# Altium integrated library main-board.IntLib: 26 symbols
Pins are listed as number, name and electrical type; pins without a type are passive.

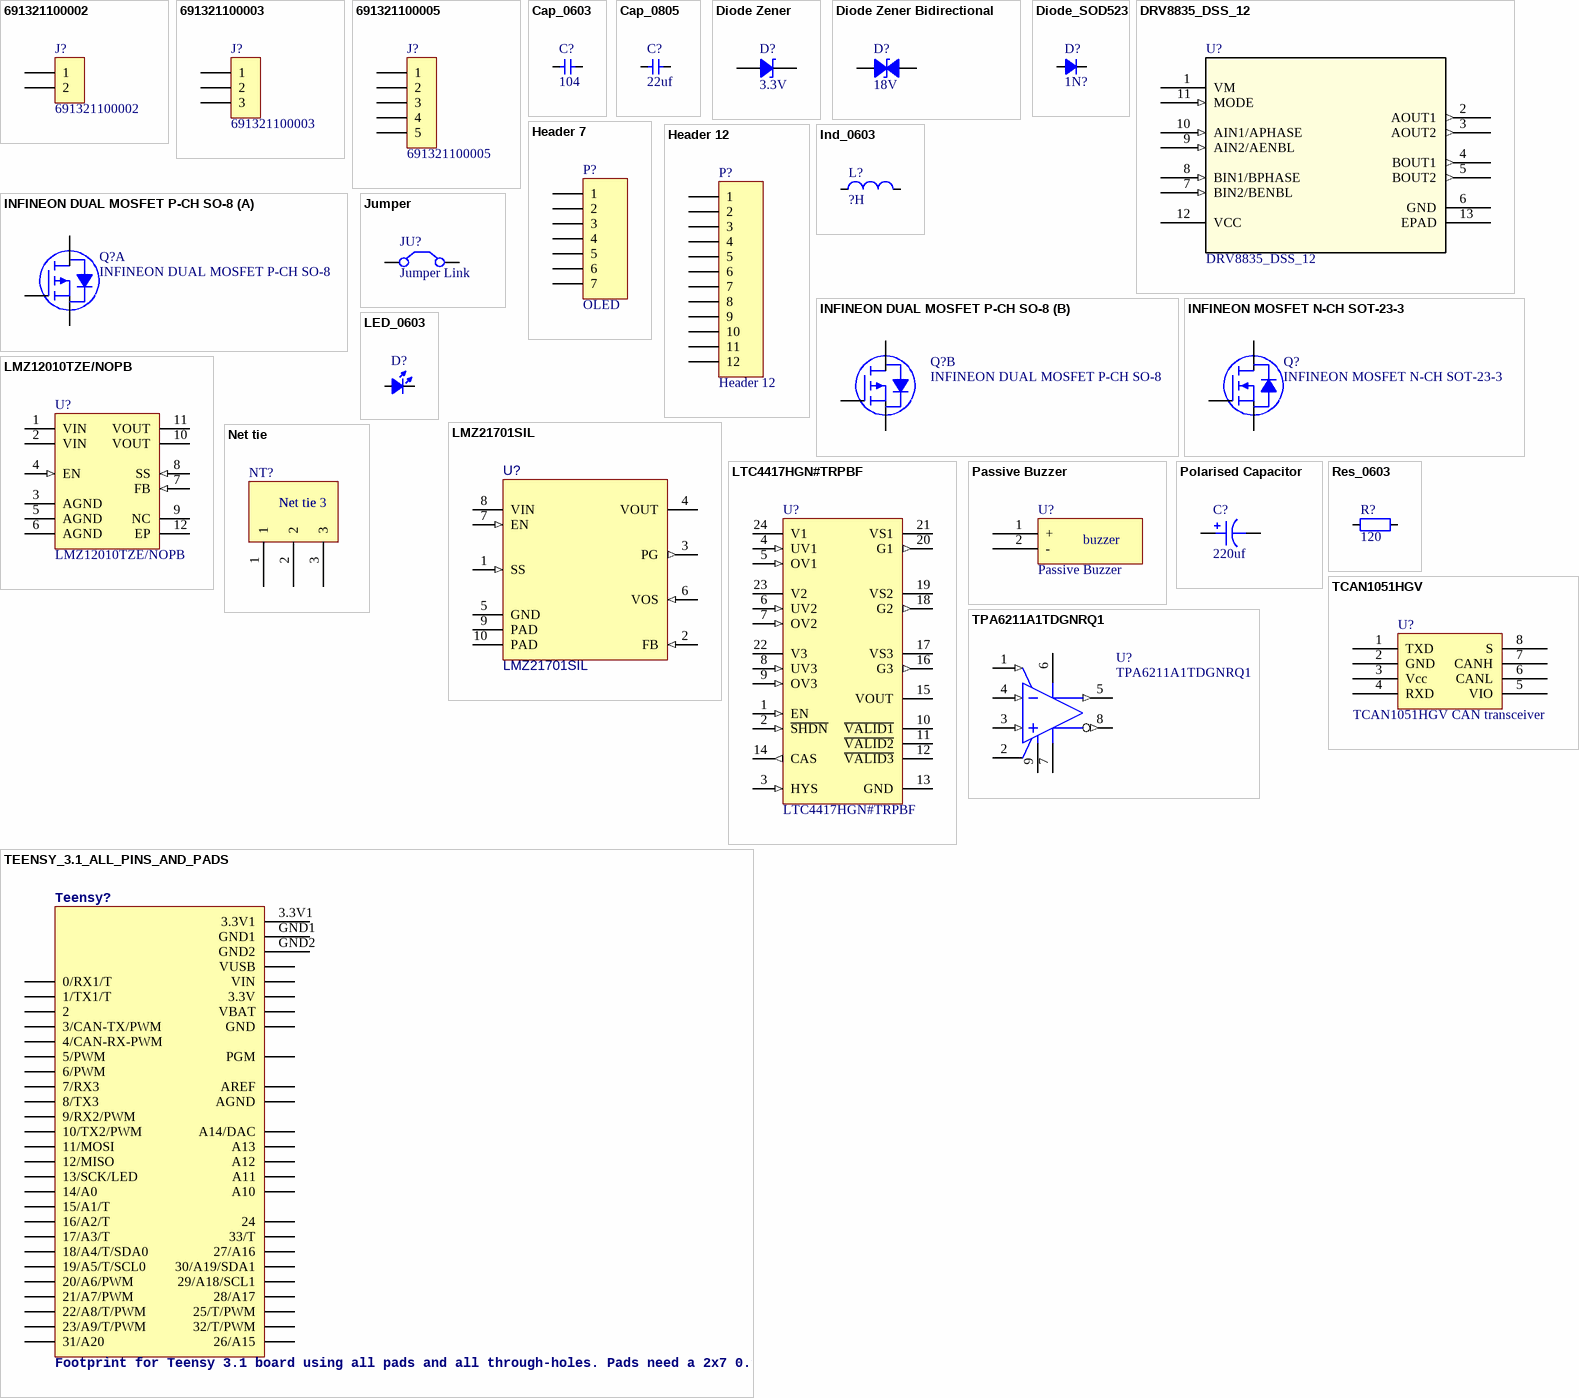
[diagram p0: symbols 691321100002 to TPA6211A1TDGNRQ1]

## 691321100002
designator J?
WR-TBL Terminal block - serie 3211 - 3.50 mm; Manufacturer: Würth Elektronik eiSos GmbH; ComponentLink1 Description: Manufacturer; ComponentLink2 Description: Datasheet; NoPins: 2; Created Date: 9 December 2013; partNo: 691321100002; ComponentLink1URL: http://www.we-online.com; ComponentLink2URL: http://katalog.we-online.de/em/datasheet/6913211000xx.pdf; Created by: Karrer Zheng
footprint 691321100002 (3,50mm - PCB Vertical - 02p)
footprint 691322110002 (3,50mm - PCB Horizontal - 02p)
pins: 1, 2

## 691321100003
designator J?
WR-TBL Terminal block - serie 3211 - 3.50 mm; Manufacturer: Würth Elektronik eiSos GmbH; ComponentLink1 Description: Manufacturer; ComponentLink2 Description: Datasheet; NoPins: 3; Created Date: 9 December 2013; partNo: 691321100003; ComponentLink1URL: http://www.we-online.com; ComponentLink2URL: http://katalog.we-online.de/em/datasheet/6913211000xx.pdf; Created by: Karrer Zheng
footprint 691321100003 (3,50mm - PCB Vertical - 03p)
footprint 691322110003 (3,50mm - PCB Horizontal - 03p)
pins: 1, 2, 3

## 691321100005
designator J?
WR-TBL Terminal block - serie 3211 - 3.50 mm; Manufacturer: Würth Elektronik eiSos GmbH; ComponentLink1 Description: Manufacturer; ComponentLink2 Description: Datasheet; NoPins: 5; Created Date: 9 December 2013; partNo: 691321100005; ComponentLink1URL: http://www.we-online.com; ComponentLink2URL: http://katalog.we-online.de/em/datasheet/6913211000xx.pdf; Created by: Karrer Zheng
footprint 691321100005 (3,50mm - PCB Vertical - 05p)
footprint 691322110005 (3,50mm - PCB Horizontal - 05p)
pins: 1, 2, 3, 4, 5

## Cap_0603
designator C?  value 104  (hidden comment: Cap_0603)
Capacitor
footprint CAP_0603
pins: 1, 2

## Cap_0805
designator C?  value 22uf  (hidden comment: Cap_0805)
Capacitor
footprint CAP_0805
pins: 1, 2

## Diode Zener
designator D?, comment 3.3V
Zener Diode
footprint SOD123F (SODFL, 2-Leads, Body 1.60x3.50mm, IPC Medium Density)
pins: 1, 2

## Diode Zener Bidirectional
designator D?, comment 18V
Bidirectional Zener Diode
footprint SOD123F (SODFL, 2-Leads, Body 1.60x3.50mm, IPC Medium Density)
pins: 1, 2

## Diode_SOD523
designator D?  value 1N?  (hidden comment: Diode_SOD523)
Diode
footprint SOD123F (SODFL, 2-Leads, Body 1.60x3.50mm, IPC Medium Density)
pins: 1 A, 2 K

## DRV8835_DSS_12
designator U?
Imported; Vendor: Texas Instruments; Manufacturer_Part_Number: drv8835_dss_12; Value: Value; Type: Type; RefDes: RefDes
footprint DSS12_P9X2
pins: 1 VM (power), 2 AOUT1 (out), 3 AOUT2 (out), 4 BOUT1 (out), 5 BOUT2 (out), 6 GND (power), 7 BIN2/BENBL (in), 8 BIN1/BPHASE (in), 9 AIN2/AENBL (in), 10 AIN1/APHASE (in), 11 MODE (in), 12 VCC (power), 13 EPAD

## Header 7
designator P?, comment OLED
Header, 7-Pin; LatestRevisionDate: 17-Jul-2002; LatestRevisionNote: Re-released for DXP Platform.; Publisher: Altium Limited
footprint HDR1X7 (Connector; Header; 7 Position)
signal-integrity model Connector
pins: 1, 2, 3, 4, 5, 6, 7

## Header 12
designator P?
Header, 12-Pin; LatestRevisionDate: 17-Jul-2002; LatestRevisionNote: Re-released for DXP Platform.; Publisher: Altium Limited
footprint HDR1X12 (Connector; Header; 12 Position)
signal-integrity model Connector
pins: 1, 2, 3, 4, 5, 6, 7, 8, 9, 10, 11, 12

## Ind_0603
designator L?  value ?H  (hidden comment: Ind_0603)
Inductor
footprint IND_0603
pins: 1, 2

## INFINEON DUAL MOSFET P-CH SO-8
designator Q?
footprint INFINEON SO-8 (SOIC, 8-Leads, Body 4.90x3.90mm, Pitch 1.27mm, IPC Medium Density)
part A pins: 1 S1, 2 G1, 7 D1, 8 D1
part B pins: 3 S2, 4 G2, 5 D2, 6 D2

## INFINEON MOSFET N-CH SOT-23-3
designator Q?
footprint INFINEON SOT-23-3 (SOT23, 3-Leads, Body 2.90x2.40mm, Pitch 0.95mm, IPC Medium Density)
pins: 1 G, 2 D, 3 S

## Jumper
designator JU?, comment Jumper Link
Jumper Wire; Published: 24-Mar-1999; LatestRevisionDate: 17-Jul-2002; LatestRevisionNote: Re-released for DXP Platform.; PackageReference: RAD-0.2; Publisher: Altium Limited; PackageDescription: Radial Cap, Thru-Hole; 2 Leads; 0.2 in Pin Spacing; ClassName: no-clearance-check
footprint jumper_56.5
pins: 1 C1, 2 C2

## LED_0603
designator D?  (value not drawn)
LED
footprint LED_0603_GREEN
footprint LED_0603_BLUE
footprint LED_0603_RED
footprint LED_0603_ORANGE
footprint LED_0603_YELLOW
pins: 1 A, 2 K

## LMZ12010TZE/NOPB
designator U?
10A, SIMPLE SWITCHER® Power Module with 20V Maximum Input, 11 pin TO-PMOD, 250 Reel; Manufacturer: National Semiconductor; PackageTopMarking: NSUZXYTTE#*LMZ12010; PowerWise: N; High-Reliability: Y; DatasheetVersion: Apr-2011; PackageVersion: revE, Apr-2011; PackageReference: TZA11A; PackageDescription: TO-PMOD, 15 x 15 x 5.9 mm Body, 11 Lead, 1.27 mm Pitch, Surface Mount; PartNumber: LMZ12010TZE/NOPB; RoHS: Y; PinCount: 11; CompType: Switcher; ComponentLink1Description: Manufacturer URL; ComponentLink1URL: http://www.national.com/; ComponentLink2Description: LMZ12010 Datasheet; ComponentLink2URL: http://www.national.com/ds/LM/LMZ12010.pdf; ComponentLink3Description: LMZ12010 Web Page; ComponentLink3URL: http://www.national.com/pf/LM/LMZ12010.html; ComponentLink4Description: TZA11A Package Page; ComponentLink4URL: http://www.national.com/packaging/folders/tza11a.html
footprint TZA11A_V (TO, 12-Leads, Body 15x15mm, Pitch 1.27mm, Lead Span 17.8mm, NSC Recommended)
pins: 1 VIN (power), 2 VIN (power), 3 AGND (power), 4 EN (in), 5 AGND (power), 6 AGND (power), 7 FB (in), 8 SS (in), 9 NC, 10 VOUT (power), 11 VOUT (power), 12 EP (power)

## LMZ21701SIL
designator U?
1A SIMPLE SWITCHER Nano Module with 17V Maximum Input Voltage, SIL0008E; Alternate Manufacturer: None; Manufacturer: Texas Instruments; SymbolCreator: a0411947; CompType: IC; U/M: EA; SymbolVersion: 2013-08-23; PartNumber: LMZ21701SIL; PackageReference: SIL0008E; MountType: SMT; ComponentLink1Description: Datasheet Link; ComponentLink1URL: https://sps06.itg.ti.com/sites/KMS/crossdivteams/altium/docs/ComponentDatasheets/LMZ21701_DS_2013_07_10.pdf; RoHS: Y; Publisher: Texas Instruments; LatestRevisionDate: 2014-08-23
footprint LMZ21701SIL
pins: 1 SS (in), 2 FB (in), 3 PG (out), 4 VOUT (power), 5 GND (power), 6 VOS (in), 7 EN (in), 8 VIN (power), 9 PAD (power), 10 PAD (power)
1 alternate drawing of the same symbol

## LTC4417HGN#TRPBF
designator U?
Prioritized PowerPath Controller, 2.5 to 36 V Vin, 24-pin SOP (GN-24), -40 to 125 degC, Pb-Free, Tape and Reel; Manufacturer: Linear Technology; Ideal Diode: Triple, External, P-Channel; PackageVersion: Rev. B, 03/2012; PackageReference: GN24; PackageDescription: 24-Pin Plastic SSOP , Body 8.5 x 3.9 mm, Pitch 0.635 mm; Supplier 1: Digi-Key; Supplier Part Number 1: LTC4417HGN#TRPBF-ND; Supplier 2: Newark; Supplier Part Number 2: 53W0557; Packing: Tape and Reel; RoHS: TRUE; Mounting Technology: Surface Mount; PartNumber: LTC4417HGN#TRPBF; ComponentLink1Description: Manufacturer URL; ComponentLink1URL: http://www.linear.com/; ComponentLink2Description: Datasheet; ComponentLink2URL: http://cds.linear.com/docs/en/datasheet/4417f.pdf; ComponentLink3Description: Package Specification; ComponentLink3URL: http://cds.linear.com/docs/en/packaging/05081641_B_GN24.pdf
footprint LT-GN-24_N (SOP, 24-Leads, Body 8.7x4mm, Pitch 0.635mm, IPC Medium Density)
footprint LT-GN-24_L (SOP, 24-Leads, Body 8.7x4mm, Pitch 0.635mm, IPC High Density)
footprint LT-GN-24_M (SOP, 24-Leads, Body 8.7x4mm, Pitch 0.635mm, IPC Low Density)
pins: 1 EN (in) "Channel Enable Input. EN is a high voltage input that allows the user to quickly connect and disconnect channels without resetting the OV/UV timers. When below 1V, all external back-to-back P-channel MOSFETs are driven off (See Datasheet)", 2 ~{SHDN} (in) "Shutdown Input. Driving S\H\D\N\ below 0.8V turns off all external back-to-back P-channel MOSFET devices, forces the LTC4417 into a low current state, and resets the 256ms timers used to validate V1, V2 and V3. Driving (See Datasheet)", 3 HYS (in) "OV/UV Comparator Hysteresis Input. Connecting HYS to ground sets a fixed 30mV hysteresis for the OV and UV comparators. Connecting a resistor, RHYS, between HYS and ground disables the internal 30mV hysteresis and sets a (See Datasheet)", 4 UV1 (in) "Undervoltage Comparator Inputs. Falling voltages below 1V signal an undervoltage event, invalidating the respective input supply channel. Connect UV1, UV2 and UV3 through a resistive divider between the respective V1, V2 and (See Datasheet)", 5 OV1 (in) "Overvoltage Comparator Inputs. Rising voltages above 1V signal an over voltage event, invalidating the respective input supply channel. Connect OV1, OV2 and OV3 to an external resistive divider from its respective V1, V2 and (See Datasheet)", 6 UV2 (in) "Undervoltage Comparator Inputs. Falling voltages below 1V signal an undervoltage event, invalidating the respective input supply channel. Connect UV1, UV2 and UV3 through a resistive divider between the respective V1, V2 and (See Datasheet)", 7 OV2 (in) "Overvoltage Comparator Inputs. Rising voltages above 1V signal an over voltage event, invalidating the respective input supply channel. Connect OV1, OV2 and OV3 to an external resistive divider from its respective V1, V2 and (See Datasheet)", 8 UV3 (in) "Undervoltage Comparator Inputs. Falling voltages below 1V signal an undervoltage event, invalidating the respective input supply channel. Connect UV1, UV2 and UV3 through a resistive divider between the respective V1, V2 and (See Datasheet)", 9 OV3 (in) "Overvoltage Comparator Inputs. Rising voltages above 1V signal an over voltage event, invalidating the respective input supply channel. Connect OV1, OV2 and OV3 to an external resistive divider from its respective V1, V2 and (See Datasheet)", 10 ~{VALID1} (oc) "Valid Channel Indicator Outputs. VA\L\I\D\1\, V\A\L\I\D\2\ and V\A\L\I\D\3\ are high voltage open drain outputs that pull low when the respective V1, V2 and V3 are within the OV/UV window for at least 256ms and release when (See Datasheet)", 11 ~{VALID2} (oc) "Valid Channel Indicator Outputs. V\A\L\I\D\1\, V\A\L\I\D\2\ and V\A\L\I\D\3\ are high voltage open drain outputs that pull low when the respective V1, V2 and V3 are within the OV/UV window for at least 256ms and release when (See Datasheet)", 12 ~{VALID3} (oc) "Valid Channel Indicator Outputs. V\A\L\I\D\1\, V\A\L\I\D\2\ and V\A\L\I\D\3\ are high voltage open drain outputs that pull low when the respective V1, V2 and V3 are within the OV/UV window for at least 256ms and release when (See Datasheet)", 13 GND (power) "Device Ground.", 14 CAS (out) "Cascade Output. Digital output used for cascading multiple LTC4417s. Connect CAS to EN of another LTC4417 to increase the number of multiplexed input supplies. CAS is pulled up to the internal VLDO voltage by an internal (See Datasheet)", 15 VOUT (power) "Output Voltage Supply and Sense. VOUT is an output voltage sense pin used to prevent any input supply from connecting to the output if the output voltage is not at least 120mV below the input supply voltage. During normal (See Datasheet)", 16 G3 (out) "P-Channel MOSFET Gate Drive Outputs. G1, G2 and G3 are used to control external back-to-back Pchannel MOSFETs. When driven low, G1, G2 and G3 are clamped 6V below their corresponding VS1, VS2 and VS3. Connect G1, G2 and G3 (See Datasheet)", 17 VS3 (power) "External P-Channel MOSFET Common Source Connection. VS1, VS2 and VS3 supply the higher voltage of V1, V2 and V3 or VOUT to the gate drivers. Connect VS1, VS2 and VS3 to the respective common source connection of the (See Datasheet)", 18 G2 (out) "P-Channel MOSFET Gate Drive Outputs. G1, G2 and G3 are used to control external back-to-back Pchannel MOSFETs. When driven low, G1, G2 and G3 are clamped 6V below their corresponding VS1, VS2 and VS3. Connect G1, G2 and G3 (See Datasheet)", 19 VS2 (power) "External P-Channel MOSFET Common Source Connection. VS1, VS2 and VS3 supply the higher voltage of V1, V2 and V3 or VOUT to the gate drivers. Connect VS1, VS2 and VS3 to the respective common source connection of the (See Datasheet)", 20 G1 (out) "P-Channel MOSFET Gate Drive Outputs. G1, G2 and G3 are used to control external back-to-back Pchannel MOSFETs. When driven low, G1, G2 and G3 are clamped 6V below their corresponding VS1, VS2 and VS3. Connect G1, G2 and G3 (See Datasheet)", 21 VS1 (power) "External P-Channel MOSFET Common Source Connection. VS1, VS2 and VS3 supply the higher voltage of V1, V2 and V3 or VOUT to the gate drivers. Connect VS1, VS2 and VS3 to the respective common source connection of the (See Datasheet)", 22 V3 (power) "Third Priority Input Supply. When V3 is within its OV/UV window for 256ms, it is connected to VOUT via its external back-to-back P-channel MOSFETs only if V1 and V2 do not meet their OV/UV requirements. Connect to ground (See Datasheet)", 23 V2 (power) "Second Priority Input Supply. When V2 is within its OV/UV window for 256ms, it is connected to VOUT via its external back-to-back P-channel MOSFETs only if V1 does not meet its OV/UV requirements. Connect to ground when (See Datasheet)", 24 V1 (power) "Highest Priority Input Supply. When V1 is within its user defined OV/UV window for 256ms, it is connected to VOUT via its external back-to-back P-channel MOSFETs. Connect V1 to ground when channel is not used. See (See Datasheet)"

## Net tie
designator NT?, comment Net tie 3  (net tie, no BOM)
footprint Net tie 3
pins: 1, 2, 3

## Passive Buzzer
designator U?
footprint HDR1X2 (Connector; Header; 2 Position)
footprint 62000211121 (2 pins, 1 row, straight, gold plating)
pins: 1 +, 2 -
text: buzzer

## Polarised Capacitor
designator C?, comment 220uf
EEE-HA1V221UP; Value: 220uf
footprint CAP ALUM 6.6MM (Aluminum Electrolytic Capacitor, Body 6.60x6.60x7.70mm, IPC Low Density)
footprint CAP ALUM 8.3MM (Aluminum Electrolytic Capacitor, Body 8.30x8.30x10.50mm, IPC Low Density)
pins: 1, 2

## Res_0603
designator R?  value 120  (hidden comment: Res_0603)
Resistor
footprint RES_0603
pins: 1, 2

## TCAN1051HGV
designator U?, comment TCAN1051HGV CAN transceiver
footprint SOIC127P600X175-8N (SOIC, 8-Leads, Body 4.91x3.90mm, Pitch 1.27mm, IPC Medium Density)
pins: 1 TXD, 2 GND, 3 Vcc, 4 RXD, 5 VIO, 6 CANL, 7 CANH, 8 S

## TEENSY_3.1_ALL_PINS_AND_PADS
designator Teensy?, comment Footprint for Teensy 3.1 board using all pads and all through-holes. Pads need a 2x7 0.1" SMD header.
footprint TEENSY_3.1_ALLPINS
pins: 0 0/RX1/T, 1 1/TX1/T, 2, 3 3/CAN-TX/PWM, 3.3V (power), 3.3V1, 4 4/CAN-RX-PWM, 5 5/PWM, 6 6/PWM, 7 7/RX3, 8 8/TX3, 9 9/RX2/PWM, 10 10/TX2/PWM, 11 11/MOSI, 12 12/MISO, 13 13/SCK/LED, 14/A0, 15/A1 15/A1/T, 16/A2 16/A2/T, 17/A3 17/A3/T, 18/A4 18/A4/T/SDA0, 19/A5 19/A5/T/SCL0, 20/A6 20/A6/PWM, 21/A7 21/A7/PWM, 22/A8 22/A8/T/PWM, 23/A9 23/A9/T/PWM, 24, 25 25/T/PWM, 26 26/A15, 27 27/A16, 28 28/A17, 29 29/A18/SCL1, 30 30/A19/SDA1, 31 31/A20, 32 32/T/PWM, 33 33/T, A10, A11, A12, A13, A14 A14/DAC, AGND (power), AREF (power), GND (power), GND1, GND2, PGM, VBAT (power), VIN (power), VUSB (power)

## TPA6211A1TDGNRQ1
designator U?
Automotive Catalog 3.1-W Mono, Fully Differential, Class-AB Audio Amplifier, -40 to 105 degC, 8-pin SOP (DGN8), Green (RoHS & no Sb/Br); Manufacturer: Texas Instruments; Output Power(W): 2.45; PSRR(dB): -85; SubFamily: Dynamic Speaker; Supply Max(Max)(Volt): 5.5; Supply Min(Min)(Volt): 2.5; DatasheetVersion: SBOS555; PackageVersion: 4073271/F, 05/2011; PackageReference: DGN8-1760X1425TP; PackageDescription: 8-Pin Plastic Small Outline, Body 3 x 3 mm, Pitch 0.65 mm; Supplier 1: Digi-Key; Supplier Part Number 1: 296-29059-2-ND; Supplier 2: Digi-Key; Supplier Part Number 2: 296-29059-1-ND; Supplier 3: Digi-Key; Supplier Part Number 3: 296-29059-6-ND; Supplier 4: Mouser; Supplier Part Number 4: 595-TPA6211A1TDGNRQ1; Eco-Plan: Green (RoHS & no Sb/Br); Speaker Amp Type: Class-AB; Speaker Channels: Mono; Mounting Technology: Surface Mount; Code_JEDEC: MO-187; PartNumber: TPA6211A1TDGNRQ1; ComponentLink1Description: Manufacturer URL; ComponentLink1URL: http://www.ti.com/; ComponentLink2Description: Datasheet; ComponentLink2URL: http://www.ti.com/general/docs/lit/getliterature.tsp?genericPartNumber=TPA6211A1-Q1&fileType=pdf; ComponentLink3Description: Package Specification; ComponentLink3URL: http://www.ti.com/litv/pdf/mpds046e
footprint TI-DGN8-1760X1425TP_N (SOP, 8-Leads, Body 3.1x3.1mm, Pitch 0.65mm, Thermal Pad 1.89x1.57mm, IPC Medium Density)
footprint TI-DGN8-1760X1425TP_L (SOP, 8-Leads, Body 3.1x3.1mm, Pitch 0.65mm, Thermal Pad 1.89x1.57mm, IPC High Density)
footprint TI-DGN8-1760X1425TP_M (SOP, 8-Leads, Body 3.1x3.1mm, Pitch 0.65mm, Thermal Pad 1.89x1.57mm, IPC Low Density)
pins: 1 ~{SHUTDOWN} (in) "Shutdown terminal (active low logic)", 2 BYPASS "Mid-supply voltage. Adding a bypass capacitor improves PSRR.", 3 IN+ (in) "Positive differential input", 4 IN- (in) "Negative differential input", 5 VO+ (out) "Positive BTL output", 6 VDD (power) "Supply voltage terminal", 7 GND (power) "High-current ground", 8 VO- (out) "Negative BTL output", 9 EP (power) "Connect to ground. Thermal pad must be soldered down in all applications to properly secure device on the PCB."